# Altium schematic symbol library Minh_Lib.SchLib: 619 symbols (part 2 of 4) (continued)
## CDRH104NP-221MC
designator H?  Supplier Part Number 1: CDRH104NP-221MC
Ind Power Shielded Wirewound 220uH 20% 1KHz 520mA Carrier T/R; Manufacturer: Sumida; DC Resistance (DCR): 960mR; Supplier 1: Avnet; Manufacturer Part Number: CDRH104NP-221MC; RoHS: Yes; Category: Fixed Inductors; Pricing 1: 1000=0.53250, 2000=0.52500, 4000=0.51000, 6000=0.49875, 8000=0.48000, 10000=0.46875, 100000=0.34648 (USD); Mount: Surface Mount; Case/Package: Nonstandard; Min Operating Temperature: -40°C; Max Operating Temperature: 100°C; Packaging: Tape and Reel; Tolerance: 20%; Shielding: Shielded; Current Rating: 520mA; Inductance: 220uH; Max DC Current: 520mA; Termination: SMD/SMT; Test Frequency: 1kHz; Series: CDRH104; Length: 0.386inch; Width: 9.2mm; Height: 5mm; Height - Seated (Max): 0.197inch; Depth: 9.2mm; Radiation Hardening: No; RoHS Compliant: Yes; ComponentLink1URL: http://www.mouser.com/ds/2/390/CDRH104-523471.pdf?src-supplier=Mouser; ComponentLink1Description: http://www.mouser.com/ds/2/390/CDRH104-523471.pdf?src-supplier=Mouser; ComponentLink2URL: http://products.sumida.com/products/pdf/CDRH104.pdf?src-supplier=Digi-Key; ComponentLink2Description: http://products.sumida.com/products/pdf/CDRH104.pdf?src-supplier=Digi-Key; ComponentLink3URL: http://www.sumida.com/products/pdf/CDRH104.pdf?src-supplier=Avnet; ComponentLink3Description: http://www.sumida.com/products/pdf/CDRH104.pdf?src-supplier=Avnet
footprint CDRH104NP (Inductor)
pins: 1, 2

## CDRH104NP-270MC
designator H?  Supplier Part Number 1: CDRH104NP-270MC
Ind Power Shielded Wirewound 27uH 20% 1KHz 1.45A Carrier T/R; Manufacturer: Sumida; DC Resistance (DCR): 110mR; Supplier 1: Avnet; Manufacturer Part Number: CDRH104NP-270MC; RoHS: Yes; Category: Fixed Inductors; Pricing 1: 1000=0.53250, 2000=0.52500, 4000=0.51000, 6000=0.49875, 8000=0.48000, 10000=0.46875, 100000=0.34648 (USD); Mount: Surface Mount; Case/Package: Nonstandard; Min Operating Temperature: -40°C; Max Operating Temperature: 100°C; Packaging: Tape and Reel; Tolerance: 20%; Current Rating: 1.45A; Shielding: Shielded; Inductance: 27uH; Test Frequency: 1kHz; Max DC Current: 1.45A; Termination: SMD/SMT; Series: CDRH104; Length: 0.386inch; Width: 0.35inch; Height: 5mm; Height - Seated (Max): 0.197inch; Depth: 9.2mm; Radiation Hardening: No; RoHS Compliant: Yes; ComponentLink1URL: http://www.mouser.com/ds/2/390/CDRH104-523471.pdf?src-supplier=Mouser; ComponentLink1Description: http://www.mouser.com/ds/2/390/CDRH104-523471.pdf?src-supplier=Mouser; ComponentLink2URL: http://products.sumida.com/products/pdf/CDRH104.pdf?src-supplier=Digi-Key; ComponentLink2Description: http://products.sumida.com/products/pdf/CDRH104.pdf?src-supplier=Digi-Key; ComponentLink3URL: http://www.sumida.com/products/pdf/CDRH104.pdf?src-supplier=Avnet; ComponentLink3Description: http://www.sumida.com/products/pdf/CDRH104.pdf?src-supplier=Avnet
footprint CDRH104NP (Inductor)
pins: 1, 2

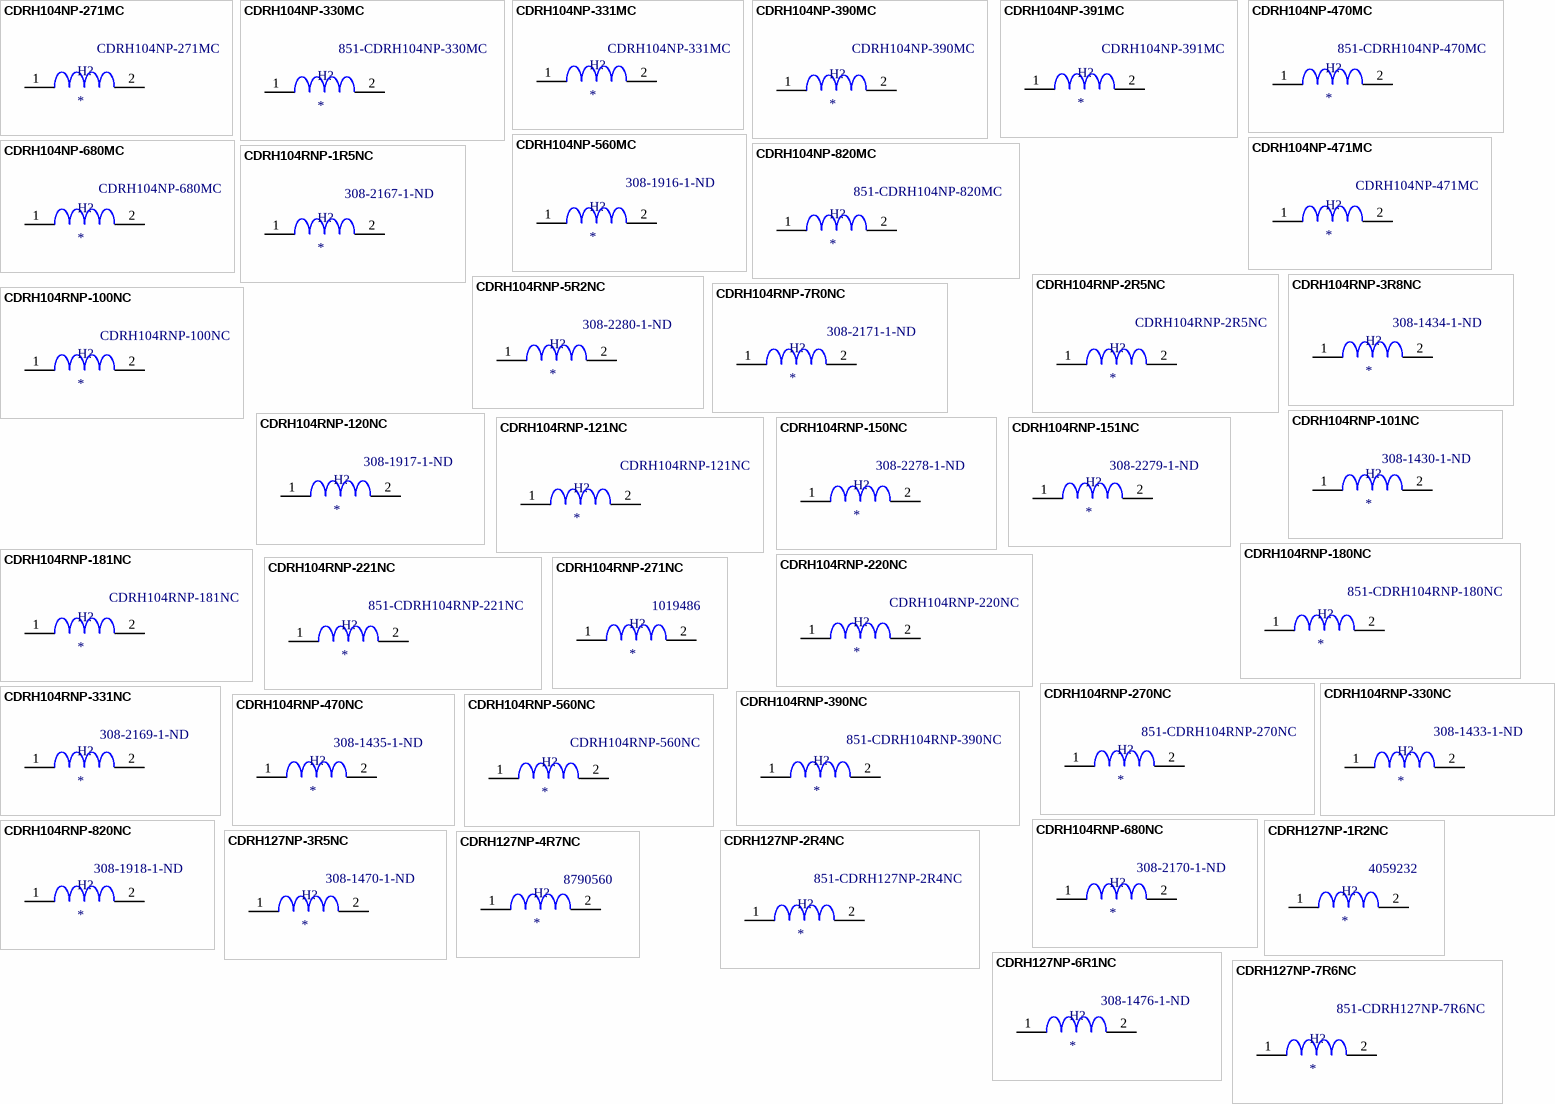
[diagram p5: symbols CDRH104NP-271MC to CDRH127NP-7R6NC]

## CDRH104NP-271MC
designator H?  Supplier Part Number 1: CDRH104NP-271MC
Ind Power Shielded Wirewound 270uH 20% 1KHz 470mA Carrier T/R; Manufacturer: Sumida; DC Resistance (DCR): 1.07R; Supplier 1: Avnet; Manufacturer Part Number: CDRH104NP-271MC; RoHS: Yes; Category: Fixed Inductors; Pricing 1: 1000=0.53250, 2000=0.52500, 4000=0.51000, 6000=0.49875, 8000=0.48000, 10000=0.46875, 100000=0.34648 (USD); Mount: Surface Mount; Case/Package: Nonstandard; Min Operating Temperature: -40°C; Max Operating Temperature: 100°C; Packaging: Tape and Reel; Tolerance: 20%; Current Rating: 470mA; Shielding: Shielded; Inductance: 270uH; Test Frequency: 1kHz; Max DC Current: 470mA; Termination: SMD/SMT; Series: CDRH104; Length: 0.386inch; Width: 0.35inch; Height: 5mm; Height - Seated (Max): 0.197inch; Depth: 9.2mm; Radiation Hardening: No; RoHS Compliant: Yes; ComponentLink1URL: http://www.mouser.com/ds/2/390/CDRH104-523471.pdf?src-supplier=Mouser; ComponentLink1Description: http://www.mouser.com/ds/2/390/CDRH104-523471.pdf?src-supplier=Mouser; ComponentLink2URL: http://products.sumida.com/products/pdf/CDRH104.pdf?src-supplier=Digi-Key; ComponentLink2Description: http://products.sumida.com/products/pdf/CDRH104.pdf?src-supplier=Digi-Key; ComponentLink3URL: http://www.sumida.com/products/pdf/CDRH104.pdf?src-supplier=Avnet; ComponentLink3Description: http://www.sumida.com/products/pdf/CDRH104.pdf?src-supplier=Avnet
footprint CDRH104NP (Inductor)
pins: 1, 2

## CDRH104NP-330MC
designator H?  Supplier Part Number 1: 851-CDRH104NP-330MC
Ind Power Shielded Wirewound 33uH 20% 1KHz 1.35A Carrier T/R; Manufacturer: Sumida; Manufacturer Part Number: CDRH104NP-330MC; DC Resistance (DCR): 150mR; Supplier 1: Mouser; RoHS: Yes; Category: Fixed Inductors; Stock 1: 9; Pricing 1: 1=1.31000, 10=1.27000, 50=1.27000, 100=0.92600, 1000=0.60100, 10000=0.57000 (USD); Mount: Surface Mount; Case/Package: Nonstandard; Min Operating Temperature: -40°C; Max Operating Temperature: 100°C; Package Quantity: 1000; Packaging: Tape and Reel; Tolerance: 20%; Shielding: Shielded; Current Rating: 1.35A; Inductance: 33uH; Max DC Current: 1.35A; Termination: SMD/SMT; Test Frequency: 1kHz; Series: CDRH104; Length: 0.386inch; Width: 9.2mm; Height: 5mm; Height - Seated (Max): 0.197inch; Depth: 9.2mm; Radiation Hardening: No; RoHS Compliant: Yes; ComponentLink1URL: http://www.mouser.com/ds/2/390/CDRH104-523471.pdf?src-supplier=Mouser; ComponentLink1Description: http://www.mouser.com/ds/2/390/CDRH104-523471.pdf?src-supplier=Mouser; ComponentLink2URL: http://www.sumida.com/products/pdf/CDRH104.pdf?src-supplier=Avnet; ComponentLink2Description: http://www.sumida.com/products/pdf/CDRH104.pdf?src-supplier=Avnet; ComponentLink3URL: http://products.sumida.com/products/pdf/CDRH104.pdf?src-supplier=Digi-Key; ComponentLink3Description: http://products.sumida.com/products/pdf/CDRH104.pdf?src-supplier=Digi-Key
footprint CDRH104NP (Inductor)
pins: 1, 2

## CDRH104NP-331MC
designator H?  Supplier Part Number 1: CDRH104NP-331MC
Ind Power Shielded Wirewound 330uH 20% 1KHz 430mA Carrier T/R; Manufacturer: Sumida; DC Resistance (DCR): 1.37R; Supplier 1: Avnet; Manufacturer Part Number: CDRH104NP-331MC; RoHS: Yes; Category: Fixed Inductors; Pricing 1: 1000=0.53250, 2000=0.52500, 4000=0.51000, 6000=0.49875, 8000=0.48000, 10000=0.46875, 100000=0.34648 (USD); Mount: Surface Mount; Case/Package: Nonstandard; Min Operating Temperature: -40°C; Max Operating Temperature: 100°C; Packaging: Tape and Reel; Tolerance: 20%; Shielding: Shielded; Current Rating: 430mA; Inductance: 330uH; Max DC Current: 430mA; Termination: SMD/SMT; Test Frequency: 1kHz; Series: CDRH104; Length: 0.386inch; Width: 9.2mm; Height: 5mm; Height - Seated (Max): 0.197inch; Depth: 9.2mm; Radiation Hardening: No; RoHS Compliant: Yes; ComponentLink1URL: http://www.mouser.com/ds/2/390/CDRH104-523471.pdf?src-supplier=Mouser; ComponentLink1Description: http://www.mouser.com/ds/2/390/CDRH104-523471.pdf?src-supplier=Mouser; ComponentLink2URL: http://www.sumida.com/products/pdf/CDRH104.pdf?src-supplier=Avnet; ComponentLink2Description: http://www.sumida.com/products/pdf/CDRH104.pdf?src-supplier=Avnet; ComponentLink3URL: http://products.sumida.com/products/pdf/CDRH104.pdf?src-supplier=Digi-Key; ComponentLink3Description: http://products.sumida.com/products/pdf/CDRH104.pdf?src-supplier=Digi-Key
footprint CDRH104NP (Inductor)
pins: 1, 2

## CDRH104NP-390MC
designator H?  Supplier Part Number 1: CDRH104NP-390MC
Ind Power Shielded Wirewound 39uH 20% 1KHz 1.2A Carrier T/R; Manufacturer: Sumida; DC Resistance (DCR): 170mR; Supplier 1: Avnet; Manufacturer Part Number: CDRH104NP-390MC; RoHS: Yes; Category: Fixed Inductors; Pricing 1: 1000=0.53250, 2000=0.52500, 4000=0.51000, 6000=0.49875, 8000=0.48000, 10000=0.46875, 100000=0.34648 (USD); Mount: Surface Mount; Case/Package: Nonstandard; Min Operating Temperature: -40°C; Max Operating Temperature: 100°C; Packaging: Tape and Reel; Tolerance: 20%; Package Quantity: 1000; Shielding: Shielded; Current Rating: 1.2A; Inductance: 39uH; Max DC Current: 1.2A; Termination: SMD/SMT; Test Frequency: 1kHz; Series: CDRH104; Length: 0.386inch; Width: 9.2mm; Height: 5mm; Height - Seated (Max): 0.197inch; Depth: 9.2mm; Radiation Hardening: No; RoHS Compliant: Yes; ComponentLink1URL: http://www.sumida.com/products/pdf/CDRH104.pdf?src-supplier=Avnet; ComponentLink1Description: http://www.sumida.com/products/pdf/CDRH104.pdf?src-supplier=Avnet; ComponentLink2URL: http://www.sumida.com/products/pdf/CDRH104.pdf?src-supplier=Mouser; ComponentLink2Description: http://www.sumida.com/products/pdf/CDRH104.pdf?src-supplier=Mouser; ComponentLink3URL: http://products.sumida.com/products/pdf/CDRH104.pdf?src-supplier=Digi-Key; ComponentLink3Description: http://products.sumida.com/products/pdf/CDRH104.pdf?src-supplier=Digi-Key
footprint CDRH104NP (Inductor)
pins: 1, 2

## CDRH104NP-391MC
designator H?  Supplier Part Number 1: CDRH104NP-391MC
Ind Power Shielded Wirewound 390uH 20% 1KHz 390mA Carrier T/R; Manufacturer: Sumida; DC Resistance (DCR): 1.55R; Supplier 1: Avnet; Manufacturer Part Number: CDRH104NP-391MC; RoHS: Yes; Category: Fixed Inductors; Pricing 1: 1000=0.53250, 2000=0.52500, 4000=0.51000, 6000=0.49875, 8000=0.48000, 10000=0.46875, 100000=0.34648 (USD); Mount: Surface Mount; Case/Package: Nonstandard; Min Operating Temperature: -40°C; Max Operating Temperature: 100°C; Packaging: Tape and Reel; Tolerance: 20%; Package Quantity: 1000; Shielding: Shielded; Current Rating: 390mA; Inductance: 390uH; Max DC Current: 390mA; Termination: SMD/SMT; Test Frequency: 1kHz; Series: CDRH104; Length: 0.386inch; Width: 9.2mm; Height: 5mm; Height - Seated (Max): 0.197inch; Depth: 9.2mm; Radiation Hardening: No; RoHS Compliant: Yes; ComponentLink1URL: http://www.mouser.com/ds/2/390/CDRH104-523471.pdf?src-supplier=Mouser; ComponentLink1Description: http://www.mouser.com/ds/2/390/CDRH104-523471.pdf?src-supplier=Mouser; ComponentLink2URL: http://www.sumida.com/products/pdf/CDRH104.pdf?src-supplier=Avnet; ComponentLink2Description: http://www.sumida.com/products/pdf/CDRH104.pdf?src-supplier=Avnet; ComponentLink3URL: http://products.sumida.com/products/pdf/CDRH104.pdf?src-supplier=Digi-Key; ComponentLink3Description: http://products.sumida.com/products/pdf/CDRH104.pdf?src-supplier=Digi-Key
footprint CDRH104NP (Inductor)
pins: 1, 2

## CDRH104NP-470MC
designator H?  Supplier Part Number 1: 851-CDRH104NP-470MC
Ind Power Shielded Wirewound 47uH 20% 1KHz 1.1A Carrier T/R; Manufacturer: Sumida; Manufacturer Part Number: CDRH104NP-470MC; DC Resistance (DCR): 210mR; Supplier 1: Mouser; RoHS: Yes; Category: Fixed Inductors; Stock 1: 690; Pricing 1: 1=1.31000, 10=1.27000, 50=1.27000, 100=0.92600, 1000=0.62900, 10000=0.59300 (USD); Mount: Surface Mount; Case/Package: Nonstandard; Min Operating Temperature: -40°C; Max Operating Temperature: 100°C; Inductance: 47uH; Test Frequency: 1kHz; Max DC Current: 1.1A; Termination: SMD/SMT; Packaging: Tape and Reel; Tolerance: 20%; Current Rating: 1.1A; Shielding: Shielded; Length: 0.386inch; Width: 0.35inch; Height: 5mm; Height - Seated (Max): 0.197inch; Depth: 9.2mm; Radiation Hardening: No; ComponentLink1URL: http://www.mouser.com/ds/2/390/CDRH104-523471.pdf?src-supplier=Mouser; ComponentLink1Description: http://www.mouser.com/ds/2/390/CDRH104-523471.pdf?src-supplier=Mouser; ComponentLink2URL: http://www.sumida.com/products/pdf/CDRH104.pdf?src-supplier=Avnet; ComponentLink2Description: http://www.sumida.com/products/pdf/CDRH104.pdf?src-supplier=Avnet; ComponentLink3URL: http://products.sumida.com/products/pdf/CDRH104.pdf?src-supplier=Digi-Key; ComponentLink3Description: http://products.sumida.com/products/pdf/CDRH104.pdf?src-supplier=Digi-Key
footprint CDRH104NP (Inductor)
pins: 1, 2

## CDRH104NP-471MC
designator H?  Supplier Part Number 1: CDRH104NP-471MC
Ind Power Shielded Wirewound 470uH 20% 1KHz 360mA Carrier T/R; Manufacturer: Sumida; DC Resistance (DCR): 1.74R; Supplier 1: Avnet; Manufacturer Part Number: CDRH104NP-471MC; RoHS: Yes; Category: Fixed Inductors; Pricing 1: 1000=0.53250, 2000=0.52500, 4000=0.51000, 6000=0.49875, 8000=0.48000, 10000=0.46875, 100000=0.34648 (USD); Mount: Surface Mount; Case/Package: Nonstandard; Min Operating Temperature: -40°C; Max Operating Temperature: 100°C; Packaging: Tape and Reel; Tolerance: 20%; Current Rating: 360mA; Shielding: Shielded; Inductance: 470uH; Test Frequency: 1kHz; Max DC Current: 360mA; Termination: SMD/SMT; Series: CDRH104; Length: 0.386inch; Width: 0.35inch; Height: 5mm; Height - Seated (Max): 0.197inch; Depth: 9.2mm; Radiation Hardening: No; RoHS Compliant: Yes; ComponentLink1URL: http://www.mouser.com/ds/2/390/CDRH104-523471.pdf?src-supplier=Mouser; ComponentLink1Description: http://www.mouser.com/ds/2/390/CDRH104-523471.pdf?src-supplier=Mouser; ComponentLink2URL: http://products.sumida.com/products/pdf/CDRH104.pdf?src-supplier=Digi-Key; ComponentLink2Description: http://products.sumida.com/products/pdf/CDRH104.pdf?src-supplier=Digi-Key; ComponentLink3URL: http://www.sumida.com/products/pdf/CDRH104.pdf?src-supplier=Avnet; ComponentLink3Description: http://www.sumida.com/products/pdf/CDRH104.pdf?src-supplier=Avnet
footprint CDRH104NP (Inductor)
pins: 1, 2

## CDRH104NP-560MC
designator H?  Supplier Part Number 1: 308-1916-1-ND
Ind Power Shielded Wirewound 56uH 20% 1KHz 1A Carrier T/R; Manufacturer: Sumida; Manufacturer Part Number: CDRH104NP-560MC; DC Resistance (DCR): 230mR; Supplier 1: Digi-Key; RoHS: Yes; Category: Fixed Inductors; Stock 1: 21; Pricing 1: 1=1.31000, 10=1.21900 (USD); Mount: Surface Mount; Case/Package: Nonstandard; Min Operating Temperature: -40°C; Max Operating Temperature: 100°C; Package Quantity: 1000; Packaging: Tape and Reel; Tolerance: 20%; Current Rating: 1A; Shielding: Shielded; Inductance: 56uH; Test Frequency: 1kHz; Max DC Current: 1A; Termination: SMD/SMT; Series: CDRH104; Length: 0.386inch; Width: 0.35inch; Height: 5mm; Height - Seated (Max): 0.197inch; Depth: 9.2mm; Radiation Hardening: No; RoHS Compliant: Yes; ComponentLink1URL: http://products.sumida.com/products/pdf/CDRH104.pdf?src-supplier=Digi-Key; ComponentLink1Description: http://products.sumida.com/products/pdf/CDRH104.pdf?src-supplier=Digi-Key; ComponentLink2URL: http://www.sumida.com/products/pdf/CDRH104.pdf?src-supplier=Avnet; ComponentLink2Description: http://www.sumida.com/products/pdf/CDRH104.pdf?src-supplier=Avnet; ComponentLink3URL: https://www.sumida.com/products/pdf/CDRH104.pdf?src-supplier=Mouser; ComponentLink3Description: https://www.sumida.com/products/pdf/CDRH104.pdf?src-supplier=Mouser
footprint CDRH104NP (Inductor)
pins: 1, 2

## CDRH104NP-680MC
designator H?  Supplier Part Number 1: CDRH104NP-680MC
Ind Power Shielded Wirewound 68uH 20% 1KHz 930mA Carrier T/R; Manufacturer: Sumida; DC Resistance (DCR): 260mR; Supplier 1: Avnet; Manufacturer Part Number: CDRH104NP-680MC; RoHS: Yes; Category: Fixed Inductors; Pricing 1: 1000=0.53250, 2000=0.52500, 4000=0.51000, 6000=0.49875, 8000=0.48000, 10000=0.46875, 100000=0.34648 (USD); Mount: Surface Mount; Case/Package: Nonstandard; Min Operating Temperature: -40°C; Max Operating Temperature: 100°C; Packaging: Tape and Reel; Tolerance: 20%; Package Quantity: 1000; Current Rating: 930mA; Shielding: Shielded; Inductance: 68uH; Test Frequency: 1kHz; Max DC Current: 930mA; Termination: SMD/SMT; Series: CDRH104; Length: 0.386inch; Width: 0.35inch; Height: 5mm; Height - Seated (Max): 0.197inch; Depth: 9.2mm; Radiation Hardening: No; RoHS Compliant: Yes; ComponentLink1URL: http://www.mouser.com/ds/2/390/CDRH104-523471.pdf?src-supplier=Mouser; ComponentLink1Description: http://www.mouser.com/ds/2/390/CDRH104-523471.pdf?src-supplier=Mouser; ComponentLink2URL: http://products.sumida.com/products/pdf/CDRH104.pdf?src-supplier=Digi-Key; ComponentLink2Description: http://products.sumida.com/products/pdf/CDRH104.pdf?src-supplier=Digi-Key; ComponentLink3URL: http://www.sumida.com/products/pdf/CDRH104.pdf?src-supplier=Avnet; ComponentLink3Description: http://www.sumida.com/products/pdf/CDRH104.pdf?src-supplier=Avnet
footprint CDRH104NP (Inductor)
pins: 1, 2

## CDRH104NP-820MC
designator H?  Supplier Part Number 1: 851-CDRH104NP-820MC
Ind Power Shielded Wirewound 82uH 20% 1KHz 840mA Carrier T/R; Manufacturer: Sumida; Manufacturer Part Number: CDRH104NP-820MC; DC Resistance (DCR): 360mR; Supplier 1: Mouser; RoHS: Yes; Category: Fixed Inductors; Stock 1: 818; Pricing 1: 1=1.31000, 10=1.27000, 50=1.27000, 100=0.92600, 1000=0.61200, 10000=0.57600 (USD); Mount: Surface Mount; Case/Package: Nonstandard; Min Operating Temperature: -40°C; Max Operating Temperature: 100°C; Packaging: Tape and Reel; Tolerance: 20%; Current Rating: 840mA; Shielding: Shielded; Inductance: 82uH; Test Frequency: 1kHz; Max DC Current: 840mA; Termination: SMD/SMT; Series: CDRH104; Length: 0.386inch; Width: 0.35inch; Height: 5mm; Height - Seated (Max): 0.197inch; Depth: 9.2mm; Radiation Hardening: No; RoHS Compliant: Yes; ComponentLink1URL: http://www.mouser.com/ds/2/390/CDRH104-523471.pdf?src-supplier=Mouser; ComponentLink1Description: http://www.mouser.com/ds/2/390/CDRH104-523471.pdf?src-supplier=Mouser; ComponentLink2URL: http://www.sumida.com/products/pdf/CDRH104.pdf?src-supplier=Avnet; ComponentLink2Description: http://www.sumida.com/products/pdf/CDRH104.pdf?src-supplier=Avnet; ComponentLink3URL: http://products.sumida.com/products/pdf/CDRH104.pdf?src-supplier=Digi-Key; ComponentLink3Description: http://products.sumida.com/products/pdf/CDRH104.pdf?src-supplier=Digi-Key
footprint CDRH104NP (Inductor)
pins: 1, 2

## CDRH104RNP-1R5NC
designator H?  Supplier Part Number 1: 308-2167-1-ND
Ind Power Shielded Wirewound 1.5uH 30% 100KHz Ferrite 6.5A Carrier T/R; Manufacturer: Sumida; Manufacturer Part Number: CDRH104RNP-1R5NC; Saturation Current: 10A; DC Resistance (DCR): 8.1mR; Supplier 1: Digi-Key; RoHS: Yes; Category: Fixed Inductors; Stock 1: 8672; Pricing 1: 1=1.78000, 10=1.64700, 25=1.51000, 50=1.29060, 100=1.15320, 250=0.98848, 500=0.93356 (USD); Mount: Surface Mount; Case/Package: Nonstandard; Core Material: Ferrite; Min Operating Temperature: -40°C; Max Operating Temperature: 100°C; Package Quantity: 1000; Packaging: Tape and Reel; Tolerance: 30%; Current Rating: 6.5A; Shielding: Shielded; Inductance: 1.5uH; Test Frequency: 100kHz; Max DC Current: 6.5A; Termination: SMD/SMT; Length: 0.402inch; Width: 0.394inch; Height: 4mm; Height - Seated (Max): 0.157inch; Depth: 10.3mm; Radiation Hardening: No; Lead Free: Lead Free; ComponentLink1URL: http://products.sumida.com/products/pdf/CDRH104R.pdf?src-supplier=Digi-Key; ComponentLink1Description: http://products.sumida.com/products/pdf/CDRH104R.pdf?src-supplier=Digi-Key; ComponentLink2URL: http://www.sumida.com/products/pdf/CDRH104,104R.pdf?src-supplier=Digi-Key; ComponentLink2Description: http://www.sumida.com/products/pdf/CDRH104,104R.pdf?src-supplier=Digi-Key; ComponentLink3URL: http://www.sumida.com/products/pdf/CDRH104,104R.pdf?src-supplier=Future+Electronics; ComponentLink3Description: http://www.sumida.com/products/pdf/CDRH104,104R.pdf?src-supplier=Future+Electronics; ComponentLink4URL: http://www.sumida.com/products/pdf/CDRH104R.pdf?src-supplier=Mouser; ComponentLink4Description: http://www.sumida.com/products/pdf/CDRH104R.pdf?src-supplier=Mouser; ComponentLink5URL: http://www.sumida.com/products/pdf/CDRH104R.pdf?src-supplier=Avnet; ComponentLink5Description: http://www.sumida.com/products/pdf/CDRH104R.pdf?src-supplier=Avnet
footprint CDRH104RNP (Inductor)
pins: 1, 2

## CDRH104RNP-2R5NC
designator H?  Supplier Part Number 1: CDRH104RNP-2R5NC
Inductor Power Shielded Drum Core 2.5uH 30% 100KHz Ferrite 6.1A 10.5mOhm DCR Carrier T/R; Manufacturer: Sumida; Saturation Current: 7.5A; DC Resistance (DCR): 10.5mR; Supplier 1: Arrow Electronics; Manufacturer Part Number: CDRH104RNP-2R5NC; RoHS: Yes; Category: Fixed Inductors; Stock 1: 852; Pricing 1: 1=1.88220, 10=1.64290, 25=1.57460, 100=1.35800, 250=1.28240, 500=1.16750 (USD); Mount: Surface Mount; Case/Package: Nonstandard; Core Material: Ferrite; Min Operating Temperature: -40°C; Max Operating Temperature: 100°C; Package Quantity: 1; Packaging: Tape and Reel; Tolerance: 30%; Shielding: Shielded; Current Rating: 6.1A; Inductance: 2.5uH; Max DC Current: 6.1A; Termination: SMD/SMT; Test Frequency: 100kHz; DC Current: 6.1A; Series: CDRH104R; Rated Current-Max: 7.5A; Length: 10.5mm; Width: 10.3mm; Height: 4mm; Height - Seated (Max): 0.157inch; Depth: 10.3mm; Radiation Hardening: No; Military Standard: Not; Lead Free: Lead Free; RoHS Compliant: Yes; ComponentLink1URL: https://datasheet.ciiva.com/26835/getdatasheetpartid-355112-26835126.pdf?src-supplier=Verical; ComponentLink1Description: https://datasheet.ciiva.com/26835/getdatasheetpartid-355112-26835126.pdf?src-supplier=Verical
footprint CDRH104RNP (Inductor)
pins: 1, 2

## CDRH104RNP-3R8NC
designator H?  Supplier Part Number 1: 308-1434-1-ND
Ind Power Shielded Wirewound 3.8uH 30% 100KHz Ferrite 5.5A Carrier T/R; Manufacturer: Sumida; Manufacturer Part Number: CDRH104RNP-3R8NC; Saturation Current: 6A; DC Resistance (DCR): 13mR; Supplier 1: Digi-Key; RoHS: Yes; Category: Fixed Inductors; Stock 1: 22889; Pricing 1: 1=1.78000, 10=1.64700, 25=1.51000, 50=1.29060, 100=1.15320, 250=0.98848, 500=0.93356 (USD); Mount: Surface Mount; Case/Package: Nonstandard; Core Material: Ferrite; Min Operating Temperature: -40°C; Max Operating Temperature: 100°C; Package Quantity: 1; Current Rating: 5.5A; Tolerance: 30%; Shielding: Shielded; Packaging: Tape and Reel; Inductance: 3.8uH; Test Frequency: 100kHz; Max DC Current: 6A; Termination: SMD/SMT; DC Current: 5.5A; Series: CDRH104R; Rated Current-Max: 6A; Length: 10.5mm; Width: 0.394inch; Height: 4mm; Height - Seated (Max): 0.157inch; Depth: 10.3mm; Radiation Hardening: No; Military Standard: Not; Lead Free: Lead Free; RoHS Compliant: Yes; ComponentLink1URL: https://datasheet.ciiva.com/26835/getdatasheetpartid-357340-26835132.pdf?src-supplier=Verical; ComponentLink1Description: https://datasheet.ciiva.com/26835/getdatasheetpartid-357340-26835132.pdf?src-supplier=Verical
footprint CDRH104RNP (Inductor)
pins: 1, 2

## CDRH104RNP-5R2NC
designator H?  Supplier Part Number 1: 308-2280-1-ND
Ind Power Shielded Wirewound 5.2uH 30% 100KHz Ferrite 5.4A Carrier T/R; Manufacturer: Sumida; Manufacturer Part Number: CDRH104RNP-5R2NC; DC Resistance (DCR): 22mR; Saturation Current: 5.5A; Supplier 1: Digi-Key; RoHS: Yes; Category: Fixed Inductors; Stock 1: 10718; Pricing 1: 1=1.78000, 10=1.64700, 25=1.51000, 50=1.29060, 100=1.15320, 250=0.98848, 500=0.93356 (USD); Mount: Surface Mount; Case/Package: Nonstandard; Core Material: Ferrite; Min Operating Temperature: -40°C; Max Operating Temperature: 100°C; Inductance: 5.2uH; Test Frequency: 100kHz; Max DC Current: 5.4A; Termination: SMD/SMT; DC Current: 5.4A; Current Rating: 5.4A; Tolerance: 30%; Shielding: Shielded; Packaging: Tape and Reel; Package Quantity: 1000; Length: 10.5mm; Width: 0.405inch; Height: 4mm; Height - Seated (Max): 0.157inch; Depth: 10.3mm; Radiation Hardening: No; Military Standard: Not; Lead Free: Lead Free; ComponentLink1URL: https://datasheet.ciiva.com/26946/getdatasheetpartid-355113-26946641.pdf?src-supplier=Verical; ComponentLink1Description: https://datasheet.ciiva.com/26946/getdatasheetpartid-355113-26946641.pdf?src-supplier=Verical; ComponentLink2URL: https://datasheet.ciiva.com/29697/cdrh104r-29697132.pdf?src-supplier=Digi-Key; ComponentLink2Description: https://datasheet.ciiva.com/29697/cdrh104r-29697132.pdf?src-supplier=Digi-Key; ComponentLink3URL: https://datasheet.ciiva.com/29697/cdrh104r-29697133.pdf?src-supplier=Digi-Key; ComponentLink3Description: https://datasheet.ciiva.com/29697/cdrh104r-29697133.pdf?src-supplier=Digi-Key; ComponentLink4URL: https://datasheet.ciiva.com/29697/cdrh104r-29697134.pdf?src-supplier=Digi-Key; ComponentLink4Description: https://datasheet.ciiva.com/29697/cdrh104r-29697134.pdf?src-supplier=Digi-Key
footprint CDRH104RNP (Inductor)
pins: 1, 2

## CDRH104RNP-7R0NC
designator H?  Supplier Part Number 1: 308-2171-1-ND
Ind Power Shielded Wirewound 7uH 30% 100KHz Ferrite 4.5A Carrier T/R; Manufacturer: Sumida; Manufacturer Part Number: CDRH104RNP-7R0NC; Saturation Current: 4.8A; DC Resistance (DCR): 27mR; Supplier 1: Digi-Key; RoHS: Yes; Category: Fixed Inductors; Stock 1: 4306; Pricing 1: 1=1.78000, 10=1.64700, 25=1.51000, 50=1.29060, 100=1.15320, 250=0.98848, 500=0.93356 (USD); Mount: Surface Mount; Case/Package: Nonstandard; Core Material: Ferrite; Weight: 0.052911oz; Min Operating Temperature: -40°C; Max Operating Temperature: 100°C; Packaging: Tape and Reel; Tolerance: 30%; Shielding: Shielded; Package Quantity: 1000; Current Rating: 4.5A; Inductance: 7uH; Test Frequency: 100kHz; Max DC Current: 4.5A; Termination: SMD/SMT; DC Current: 4.5A; Series: CDRH; Length: 10.5mm; Width: 0.405inch; Height: 4mm; Height - Seated (Max): 0.157inch; Depth: 10.3mm; Radiation Hardening: No; Military Standard: Not; Lead Free: Lead Free; RoHS Compliant: Yes; ComponentLink1URL: https://datasheet.ciiva.com/1009/lf2020-1009625.pdf?src-supplier=Avnet; ComponentLink1Description: https://datasheet.ciiva.com/1009/lf2020-1009625.pdf?src-supplier=Avnet; ComponentLink2URL: https://datasheet.ciiva.com/26946/getdatasheetpartid-791243-26946642.pdf?src-supplier=Verical; ComponentLink2Description: https://datasheet.ciiva.com/26946/getdatasheetpartid-791243-26946642.pdf?src-supplier=Verical
footprint CDRH104RNP (Inductor)
pins: 1, 2

## CDRH104RNP-100NC
designator H?  Supplier Part Number 1: CDRH104RNP-100NC
Ind Power Shielded Wirewound 10uH 30% 100KHz Ferrite 3.8A Carrier T/R; Manufacturer: Sumida; Saturation Current: 4.4A; DC Resistance (DCR): 35mR; Supplier 1: Arrow Electronics; Manufacturer Part Number: CDRH104RNP-100NC; RoHS: Yes; Category: Fixed Inductors; Stock 1: 58; Pricing 1: 1=1.75870, 10=1.27580, 25=1.26300 (USD); Mount: Surface Mount; Case/Package: Nonstandard; Core Material: Ferrite; Weight: 0.052911oz; Min Operating Temperature: -40°C; Max Operating Temperature: 100°C; Shielding: Shielded; Packaging: Tape and Reel; Tolerance: 30%; Package Quantity: 1; Current Rating: 3.8A; Inductance: 10uH; Test Frequency: 100kHz; Max DC Current: 3.8A; Termination: SMD/SMT; DC Current: 3.8A; Series: CDRH104R; Rated Current-Max: 4.4A; Length: 10.5mm; Width: 0.394inch; Height: 4mm; Height - Seated (Max): 0.157inch; Depth: 10.3mm; Radiation Hardening: No; Military Standard: Not; Lead Free: Lead Free; RoHS Compliant: Yes; ComponentLink1URL: http://products.sumida.com/products/pdf/CDRH104R.pdf?src-supplier=Digi-Key; ComponentLink1Description: http://products.sumida.com/products/pdf/CDRH104R.pdf?src-supplier=Digi-Key; ComponentLink2URL: http://www.sumida.com/products/pdf/CDRH104R.pdf?src-supplier=Mouser; ComponentLink2Description: http://www.sumida.com/products/pdf/CDRH104R.pdf?src-supplier=Mouser; ComponentLink3URL: http://www.sumida.com/products/pdf/CDRH104R.pdf?src-supplier=Avnet; ComponentLink3Description: http://www.sumida.com/products/pdf/CDRH104R.pdf?src-supplier=Avnet; ComponentLink4URL: http://components.arrow.com/part/dataview/51004634S8883357N4456?src-supplier=Arrow+Electronics; ComponentLink4Description: http://components.arrow.com/part/dataview/51004634S8883357N4456?src-supplier=Arrow+Electronics; ComponentLink5URL: http://www.sumida.com/products/pdf/CDRH104,104R.pdf?src-supplier=Future+Electronics; ComponentLink5Description: http://www.sumida.com/products/pdf/CDRH104,104R.pdf?src-supplier=Future+Electronics; ComponentLink6URL: https://www.verical.com/server-webapp/html/getDatasheet?partID=359493&src-supplier=Verical; ComponentLink6Description: https://www.verical.com/server-webapp/html/getDatasheet?partID=359493&src-supplier=Verical
footprint CDRH104RNP (Inductor)
pins: 1, 2

## CDRH104RNP-101NC
designator H?  Supplier Part Number 1: 308-1430-1-ND
Ind Power Shielded Wirewound 100uH 30% 100KHz Ferrite 1.25A Carrier T/R; Manufacturer: Sumida; Manufacturer Part Number: CDRH104RNP-101NC; Saturation Current: 1.35A; DC Resistance (DCR): 304mR; Supplier 1: Digi-Key; RoHS: Yes; Category: Fixed Inductors; Stock 1: 1308; Pricing 1: 1=1.78000, 10=1.64700, 25=1.51000, 50=1.29060, 100=1.15320, 250=0.98848, 500=0.93356 (USD); Mount: Surface Mount; Case/Package: Nonstandard; Core Material: Ferrite; Weight: 0.052911oz; Min Operating Temperature: -40°C; Max Operating Temperature: 100°C; Package Quantity: 1; Packaging: Tape and Reel; Tolerance: 30%; Shielding: Shielded; Current Rating: 1.25A; Inductance: 100uH; Max DC Current: 1.25A; Termination: SMD/SMT; Test Frequency: 100kHz; DC Current: 1.25A; Series: CDRH104R; Rated Current-Max: 1.35A; Length: 10.5mm; Width: 10.3mm; Height: 4mm; Height - Seated (Max): 0.157inch; Depth: 10.3mm; Radiation Hardening: No; Military Standard: Not; Lead Free: Lead Free; RoHS Compliant: Yes; ComponentLink1URL: http://components.arrow.com/part/dataview/51004615S8961736N4456?src-supplier=Arrow+Electronics; ComponentLink1Description: http://components.arrow.com/part/dataview/51004615S8961736N4456?src-supplier=Arrow+Electronics; ComponentLink2URL: http://www.sumida.com/products/pdf/CDRH104R.pdf?src-supplier=Mouser; ComponentLink2Description: http://www.sumida.com/products/pdf/CDRH104R.pdf?src-supplier=Mouser; ComponentLink3URL: http://www.sumida.com/products/pdf/CDRH104,104R.pdf?src-supplier=Future+Electronics; ComponentLink3Description: http://www.sumida.com/products/pdf/CDRH104,104R.pdf?src-supplier=Future+Electronics; ComponentLink4URL: https://www.verical.com/server-webapp/html/getDatasheet?partID=357338&src-supplier=Verical; ComponentLink4Description: https://www.verical.com/server-webapp/html/getDatasheet?partID=357338&src-supplier=Verical; ComponentLink5URL: http://www.sumida.com/products/pdf/CDRH104R.pdf?src-supplier=Avnet; ComponentLink5Description: http://www.sumida.com/products/pdf/CDRH104R.pdf?src-supplier=Avnet; ComponentLink6URL: http://products.sumida.com/products/pdf/CDRH104R.pdf?src-supplier=Digi-Key; ComponentLink6Description: http://products.sumida.com/products/pdf/CDRH104R.pdf?src-supplier=Digi-Key
footprint CDRH104RNP (Inductor)
pins: 1, 2

## CDRH104RNP-120NC
designator H?  Supplier Part Number 1: 308-1917-1-ND
Ind Power Shielded Wirewound 12uH 30% 100KHz Ferrite 3.4A Carrier T/R; Manufacturer: Sumida; Manufacturer Part Number: CDRH104RNP-120NC; Saturation Current: 3.7A; DC Resistance (DCR): 46mR; Max DC Current: 6.5A; Supplier 1: Digi-Key; RoHS: Yes; Category: Fixed Inductors; Stock 1: 274; Pricing 1: 1=1.78000, 10=1.64700, 25=1.51000, 50=1.29060, 100=1.15320, 250=0.98848, 500=0.93356 (USD); Mount: Surface Mount; Case/Package: Nonstandard; Core Material: Ferrite; Min Operating Temperature: -40°C; Max Operating Temperature: 100°C; Package Quantity: 1000; Packaging: Tape and Reel; Tolerance: 30%; Shielding: Shielded; Current Rating: 3.4A; Inductance: 12uH; Test Frequency: 100kHz; Termination: SMD/SMT; Series: CDRH104R; Rated Current-Max: 3.7A; Length: 0.402inch; Width: 0.394inch; Height: 4mm; Height - Seated (Max): 0.157inch; Depth: 10.3mm; Radiation Hardening: No; Lead Free: Lead Free; RoHS Compliant: Yes; ComponentLink1URL: http://www.sumida.com/en/products/search_advanced_pi_list.php?txtPartNo=CDRH104RNP&ProdType=CDRH104RNP&src-supplier=Mouser; ComponentLink1Description: http://www.sumida.com/en/products/search_advanced_pi_list.php?txtPartNo=CDRH104RNP&ProdType=CDRH104RNP&src-supplier=Mouser; ComponentLink2URL: http://products.sumida.com/products/pdf/CDRH104R.pdf?src-supplier=Digi-Key; ComponentLink2Description: http://products.sumida.com/products/pdf/CDRH104R.pdf?src-supplier=Digi-Key; ComponentLink3URL: http://www.sumida.com/products/pdf/CDRH104R.pdf?src-supplier=Avnet; ComponentLink3Description: http://www.sumida.com/products/pdf/CDRH104R.pdf?src-supplier=Avnet; ComponentLink4URL: http://www.sumida.com/products/pdf/CDRH104R.pdf?src-supplier=Future+Electronics; ComponentLink4Description: http://www.sumida.com/products/pdf/CDRH104R.pdf?src-supplier=Future+Electronics
footprint CDRH104RNP (Inductor)
pins: 1, 2

## CDRH104RNP-121NC
designator H?  Supplier Part Number 1: CDRH104RNP-121NC
Ind Power Shielded Wirewound 120uH 30% 100KHz Ferrite 1.08A Carrier T/R; Manufacturer: Sumida; Current Rating: 700mA; DC Resistance (DCR): 450mR; Test Frequency: 1kHz; Max DC Current: 6.5A; Supplier 1: Avnet; Manufacturer Part Number: CDRH104RNP-121NC; RoHS: Yes; Category: Fixed Inductors; Pricing 1: 1000=0.74266, 2000=0.73220, 4000=0.71128, 6000=0.69559, 8000=0.66944, 10000=0.65375, 100000=0.48800 (USD); Mount: Surface Mount; Case/Package: Nonstandard; Core Material: Ferrite; Min Operating Temperature: -40°C; Max Operating Temperature: 100°C; Package Quantity: 1000; Packaging: Tape and Reel; Tolerance: 30%; Shielding: Shielded; Inductance: 120uH; Termination: SMD/SMT; Series: CDRH104; Length: 0.402inch; Width: 0.394inch; Height: 4mm; Height - Seated (Max): 0.157inch; Depth: 10.3mm; Radiation Hardening: No; RoHS Compliant: Yes; ComponentLink1URL: http://products.sumida.com/products/pdf/CDRH104R.pdf?src-supplier=Digi-Key; ComponentLink1Description: http://products.sumida.com/products/pdf/CDRH104R.pdf?src-supplier=Digi-Key; ComponentLink2URL: http://www.sumida.com/en/products/search_advanced_pi_list.php?txtPartNo=CDRH104RNP&ProdType=CDRH104RNP&src-supplier=Mouser; ComponentLink2Description: http://www.sumida.com/en/products/search_advanced_pi_list.php?txtPartNo=CDRH104RNP&ProdType=CDRH104RNP&src-supplier=Mouser; ComponentLink3URL: http://www.sumida.com/products/pdf/CDRH104R.pdf?src-supplier=Avnet; ComponentLink3Description: http://www.sumida.com/products/pdf/CDRH104R.pdf?src-supplier=Avnet
footprint CDRH104RNP (Inductor)
pins: 1, 2

## CDRH104RNP-150NC
designator H?  Supplier Part Number 1: 308-2278-1-ND
Ind Power Shielded Wirewound 15uH 30% 100KHz Ferrite 3.1A Carrier T/R; Manufacturer: Sumida; Manufacturer Part Number: CDRH104RNP-150NC; Saturation Current: 3.6A; DC Resistance (DCR): 50mR; Supplier 1: Digi-Key; RoHS: Yes; Category: Fixed Inductors; Stock 1: 41837; Pricing 1: 1=1.78000, 10=1.64700, 25=1.51000, 50=1.29060, 100=1.15320, 250=0.98848, 500=0.93356 (USD); Mount: Surface Mount; Case/Package: Nonstandard; Core Material: Ferrite; Min Operating Temperature: -40°C; Max Operating Temperature: 100°C; Package Quantity: 1000; Current Rating: 3.1A; Tolerance: 30%; Shielding: Shielded; Packaging: Tape and Reel; Inductance: 15uH; Test Frequency: 100kHz; Max DC Current: 3.1A; Termination: SMD/SMT; DC Current: 3.1A; Series: CDRH; Rated Current-Max: 3.6A; Length: 10.5mm; Width: 0.405inch; Height: 4mm; Height - Seated (Max): 0.157inch; Depth: 10.3mm; Radiation Hardening: No; Military Standard: Not; Lead Free: Lead Free; RoHS Compliant: Yes; ComponentLink1URL: https://datasheet.ciiva.com/29696/cdrh104r-29696346.pdf?src-supplier=Digi-Key; ComponentLink1Description: https://datasheet.ciiva.com/29696/cdrh104r-29696346.pdf?src-supplier=Digi-Key; ComponentLink2URL: https://datasheet.ciiva.com/29696/cdrh104r-29696347.pdf?src-supplier=Digi-Key; ComponentLink2Description: https://datasheet.ciiva.com/29696/cdrh104r-29696347.pdf?src-supplier=Digi-Key; ComponentLink3URL: https://datasheet.ciiva.com/29696/cdrh104r-29696348.pdf?src-supplier=Digi-Key; ComponentLink3Description: https://datasheet.ciiva.com/29696/cdrh104r-29696348.pdf?src-supplier=Digi-Key
footprint CDRH104RNP (Inductor)
pins: 1, 2

## CDRH104RNP-151NC
designator H?  Supplier Part Number 1: 308-2279-1-ND
Ind Power Shielded Wirewound 150uH 30% 100KHz Ferrite 850mA Carrier T/R; Manufacturer: Sumida; Manufacturer Part Number: CDRH104RNP-151NC; Saturation Current: 1.15A; DC Resistance (DCR): 506mR; Supplier 1: Digi-Key; RoHS: Yes; Category: Fixed Inductors; Stock 1: 9898; Pricing 1: 1=1.78000, 10=1.64700, 25=1.51000, 50=1.29060, 100=1.15320, 250=0.98848, 500=0.93356 (USD); Mount: Surface Mount; Case/Package: Nonstandard; Core Material: Ferrite; Weight: 0.052911oz; Min Operating Temperature: -40°C; Max Operating Temperature: 100°C; Package Quantity: 1000; Current Rating: 850mA; Tolerance: 30%; Shielding: Shielded; Packaging: Tape and Reel; Inductance: 150uH; Test Frequency: 100kHz; Max DC Current: 850mA; Termination: SMD/SMT; Series: CDRH; Length: 0.402inch; Width: 0.405inch; Height: 4mm; Height - Seated (Max): 0.157inch; Depth: 10.3mm; Radiation Hardening: No; Lead Free: Lead Free; RoHS Compliant: Yes; ComponentLink1URL: http://www.sumida.com/products/pdf/CDRH104,104R.pdf?src-supplier=Digi-Key; ComponentLink1Description: http://www.sumida.com/products/pdf/CDRH104,104R.pdf?src-supplier=Digi-Key; ComponentLink2URL: http://www.sumida.com/products/pdf/CDRH104R.pdf?src-supplier=Mouser; ComponentLink2Description: http://www.sumida.com/products/pdf/CDRH104R.pdf?src-supplier=Mouser; ComponentLink3URL: http://products.sumida.com/products/pdf/CDRH104R.pdf?src-supplier=Digi-Key; ComponentLink3Description: http://products.sumida.com/products/pdf/CDRH104R.pdf?src-supplier=Digi-Key; ComponentLink4URL: http://www.sumida.com/products/pdf/CDRH104,104R.pdf?src-supplier=Future+Electronics; ComponentLink4Description: http://www.sumida.com/products/pdf/CDRH104,104R.pdf?src-supplier=Future+Electronics; ComponentLink5URL: http://www.sumida.com/products/pdf/CDRH104R.pdf?src-supplier=Avnet; ComponentLink5Description: http://www.sumida.com/products/pdf/CDRH104R.pdf?src-supplier=Avnet
footprint CDRH104RNP (Inductor)
pins: 1, 2
